# Altium footprint library Main Shield Board.PcbLib: 7 footprints
Each footprint in its own frame and in the unit in brackets; x right, y up, seen from the top. Pads: shape width x height; smd on the part's side, far side on the other; paste and mask are expansions set on the pad; w line width, h text height; cw(c..) or ccw(c..) is an arc to the next point about the centre after c.
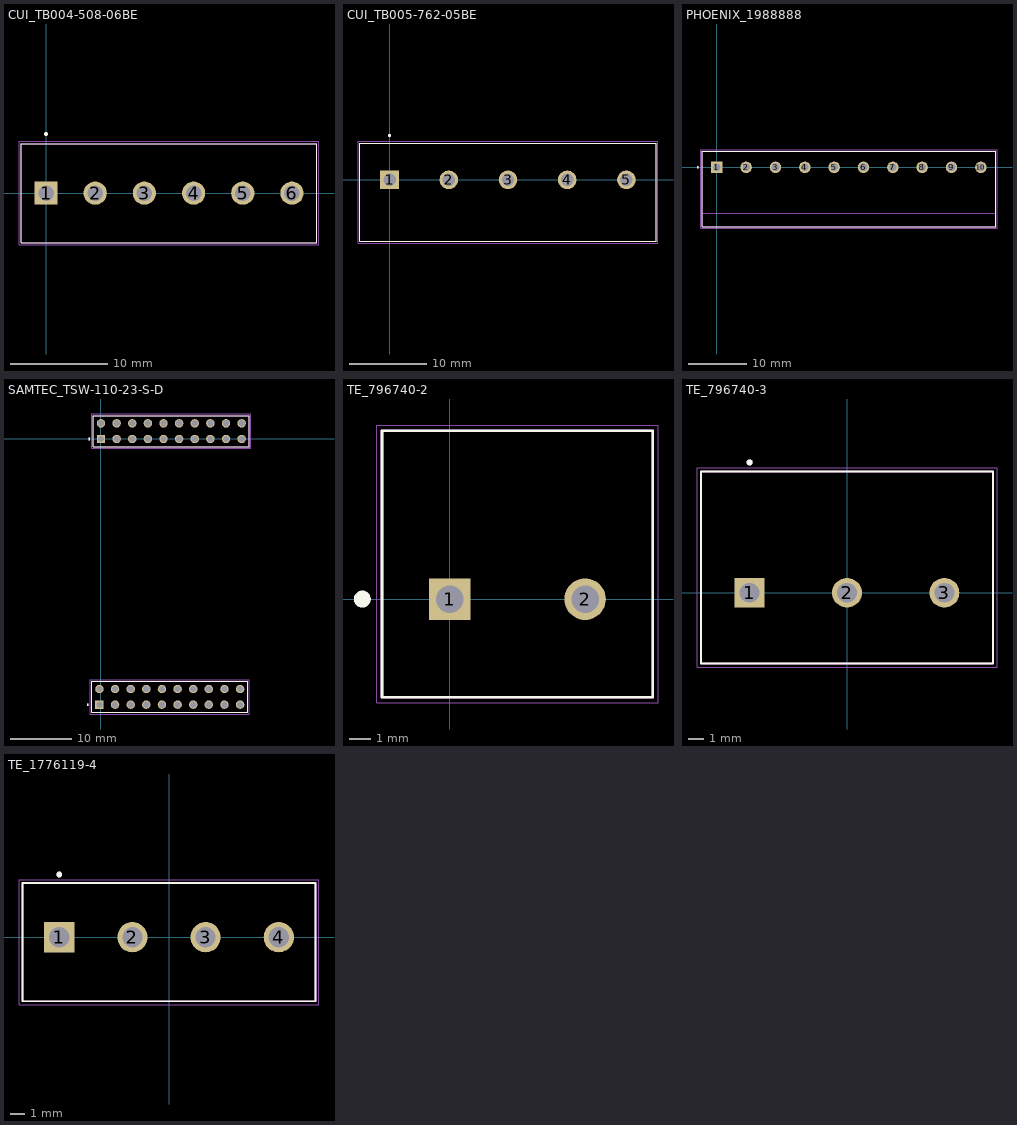
[diagram p0: the footprints below, top view; thin cyan lines are the x and y axes]

## CUI_TB004-508-06BE [mm]
pads (6):
  rect 2.4x2.4 hole 1.6: 1(0,0)
  round 2.4 hole 1.6: 2(5.08,0) 3(10.16,0) 4(15.24,0) 5(20.32,0) 6(25.4,0)
Top Overlay:
  circle w0.2: c0,6.1 r0.1
  lines w0.127: -2.54,-5.1 27.94,-5.1 27.94,5.1 -2.54,5.1 -2.54,-5.1
Mechanical 13:
  circle w0.2: c0,6.1 r0.1
  lines w0.127: -2.54,-5.1 27.94,-5.1 27.94,5.1 -2.54,5.1 -2.54,-5.1
Mechanical 15:
  lines w0.05: -2.79,-5.35 -2.79,5.35 28.19,5.35 28.19,-5.35 -2.79,-5.35

## CUI_TB005-762-05BE [mm]
pads (5):
  rect 2.4x2.4 hole 1.6: 1(0,0)
  round 2.4 hole 1.6: 2(7.62,0) 3(15.24,0) 4(22.86,0) 5(30.48,0)
Top Overlay:
  circle w0.2: c0,5.7 r0.1
  lines w0.127: -3.81,-7.9 34.29,-7.9 34.29,4.7 -3.81,4.7 -3.81,-7.9
Mechanical 13:
  circle w0.2: c0,5.7 r0.1
  lines w0.127: -3.81,-7.9 34.29,-7.9 34.29,4.7 -3.81,4.7 -3.81,-7.9
Mechanical 15:
  lines w0.05: -4.06,-8.15 -4.06,4.95 34.54,4.95 34.54,-8.15 -4.06,-8.15

## PHOENIX_1988888 [mm]
pads (10):
  rect 1.95x1.95 hole 1.3: 1(0,0)
  round 1.95 hole 1.3: 2(5,0) 3(10,0) 4(15,0) 5(20,0) 6(25,0) 7(30,0) 8(35,0) 9(40,0) 10(45,0)
Top Overlay:
  circle w0.2: c-3.279,0 r0.1
  lines w0.127: -2.5,-10.1 47.5,-10.1 47.5,2.7 -2.5,2.7 -2.5,-10.1
Mechanical 13:
  circle w0.2: c-3.279,0 r0.1
  lines w0.127: -2.5,-7.8 47.5,-7.8 ; -2.5,-7.8 -2.5,-10.1 47.5,-10.1 47.5,-7.8 ; -2.5,-7.8 -2.5,2.7 47.5,2.7 47.5,-7.8
Mechanical 15:
  lines w0.05: -2.75,-10.35 47.75,-10.35 47.75,2.95 -2.75,2.95 -2.75,-10.35
3D body "1988888.stp": height 11.93, standoff -3.48, extent -3.048,-10.109 47.522,2.711

## SAMTEC_TSW-110-23-S-D [mm]
pads (40):
  round 1.37 hole 1.02: +3.3V(22.86,2.54) GND(20.32,0) GND(22.606,-43.18) P30(17.526,-43.18) PA3(2.286,-43.18) PA4(4.826,-43.18) PA5(5.08,2.54) PA6(2.54,2.54) PA7(0,2.54) PB0(17.78,2.54) PB1(15.24,2.54) PB2(20.066,-43.18) PB3(17.526,-40.64) PB4(7.62,2.54) PB5(20.32,2.54) PB6(7.366,-43.18) PB7(9.906,-43.18) PC4(14.986,-40.64) PC5(12.446,-40.64) PC6(9.906,-40.64) PC7(7.366,-40.64) PD0(17.78,0) PD1(15.24,0) PD2(12.7,0) PD3(10.16,0) PD6(4.826,-40.64) PD7(2.286,-40.64) PE1(7.62,0) PE2(5.08,0) PE3(2.54,0) PE4(12.7,2.54) PE5(10.16,2.54) PF0(14.986,-43.18) PF2(22.606,-40.64) PF3(20.066,-40.64) PF4(-0.254,-40.64) RST(12.446,-43.18) VBUS(22.86,0)
  rect 1.37x1.37 hole 1.02: PA2(-0.254,-43.18) PF1(0,0)
Top Overlay:
  circle w0.2: c-1.92,0 r0.1
  circle w0.2: c-2.174,-43.18 r0.1
  lines w0.2: -1.524,-44.45 -1.524,-39.37 23.876,-39.37 23.876,-44.45 -1.524,-44.45 ; -1.27,-1.27 -1.27,3.81 24.13,3.81 24.13,-1.27 -1.27,-1.27
Mechanical 13:
  circle w0.2: c-1.92,0 r0.1
  circle w0.2: c-2.174,-43.18 r0.1
  lines w0.1: -1.524,-44.45 -1.524,-39.37 23.876,-39.37 23.876,-44.45 -1.524,-44.45 ; -1.27,-1.27 -1.27,3.81 24.13,3.81 24.13,-1.27 -1.27,-1.27
Mechanical 15:
  lines w0.05: -1.774,-44.7 -1.774,-39.12 24.126,-39.12 24.126,-44.7 -1.774,-44.7 ; -1.52,-1.52 -1.52,4.06 24.38,4.06 24.38,-1.52 -1.52,-1.52
3D body "TSW-110-23-S-D.stp": height 8.31, standoff -3, extent -1.27,-1.143 24.13,3.937
3D body "TM4c.SLDPRT": height 19.91, standoff 2.41, extent -11.938,-45.593 54.102,5.207
3D body "TSW-110-23-S-D.stp": height 8.38, standoff -2.92, extent -1.524,-44.45 23.876,-39.37

## TE_796740-2 [mm]
pads (2):
  rect 1.95x1.95 hole 1.3: 1(0,0)
  round 1.95 hole 1.3: 2(6.35,0)
Top Overlay:
  circle w0.4: c-4.105,0 r0.2
  lines w0.127: -3.18,-4.6 -3.18,7.9 9.52,7.9 9.52,-4.6 -3.18,-4.6
Mechanical 13:
  lines w0.127: -3.18,-4.6 -3.18,7.9 9.52,7.9 9.52,-4.6 -3.18,-4.6
Mechanical 15:
  lines w0.05: -3.43,-4.85 9.77,-4.85 9.77,8.15 -3.43,8.15 -3.43,-4.85
3D body "796740-2--3DModel-STEP-1.STEP": height 21.51, standoff -4.99, extent -3.775,-4.626 9.525,7.874

## TE_796740-3 [mm]
pads (3):
  rect 1.95x1.95 hole 1.3: 1(-6.35,0)
  round 1.95 hole 1.3: 2(0,0) 3(6.35,0)
Top Overlay:
  circle w0.2: c-6.35,8.5 r0.1
  lines w0.127: -9.53,-4.6 9.53,-4.6 9.53,7.9 -9.53,7.9 -9.53,-4.6
Mechanical 13:
  circle w0.2: c-6.35,8.5 r0.1
  lines w0.127: -9.53,-4.6 9.53,-4.6 9.53,7.9 -9.53,7.9 -9.53,-4.6
Mechanical 15:
  lines w0.05: -9.78,-4.85 9.78,-4.85 9.78,8.15 -9.78,8.15 -9.78,-4.85
3D body "step_temp.STEP": height 21.51, standoff -4.99, extent -10.079,-4.626 9.571,7.874

## TE_1776119-4 [mm]
pads (4):
  rect 2.1x2.1 hole 1.4: 1(-7.62,0)
  round 2.1 hole 1.4: 2(-2.54,0) 3(2.54,0) 4(7.62,0)
Top Overlay:
  circle w0.2: c-7.62,4.35 r0.1
  lines w0.127: -10.16,-4.45 -10.16,3.75 10.16,3.75 10.16,-4.45 -10.16,-4.45
Mechanical 13:
  circle w0.2: c-7.62,4.35 r0.1
  lines w0.127: -10.16,-4.45 -10.16,3.75 10.16,3.75 10.16,-4.45 -10.16,-4.45
Mechanical 15:
  lines w0.05: -10.41,-4.7 -10.41,4 10.41,4 10.41,-4.7 -10.41,-4.7
3D body "1776119-4--3DModel-STEP-1.STEP": height 10.01, standoff -2.59, extent -10.16,-4.445 10.16,3.755